# Altium footprint library ATROTECH.PcbLib: 334 footprints (part 19 of 21)
Each footprint in its own frame and in the unit in brackets; x right, y up, seen from the top. Pads: shape width x height; smd on the part's side, far side on the other; paste and mask are expansions set on the pad; w line width, h text height; cw(c..) or ccw(c..) is an arc to the next point about the centre after c.
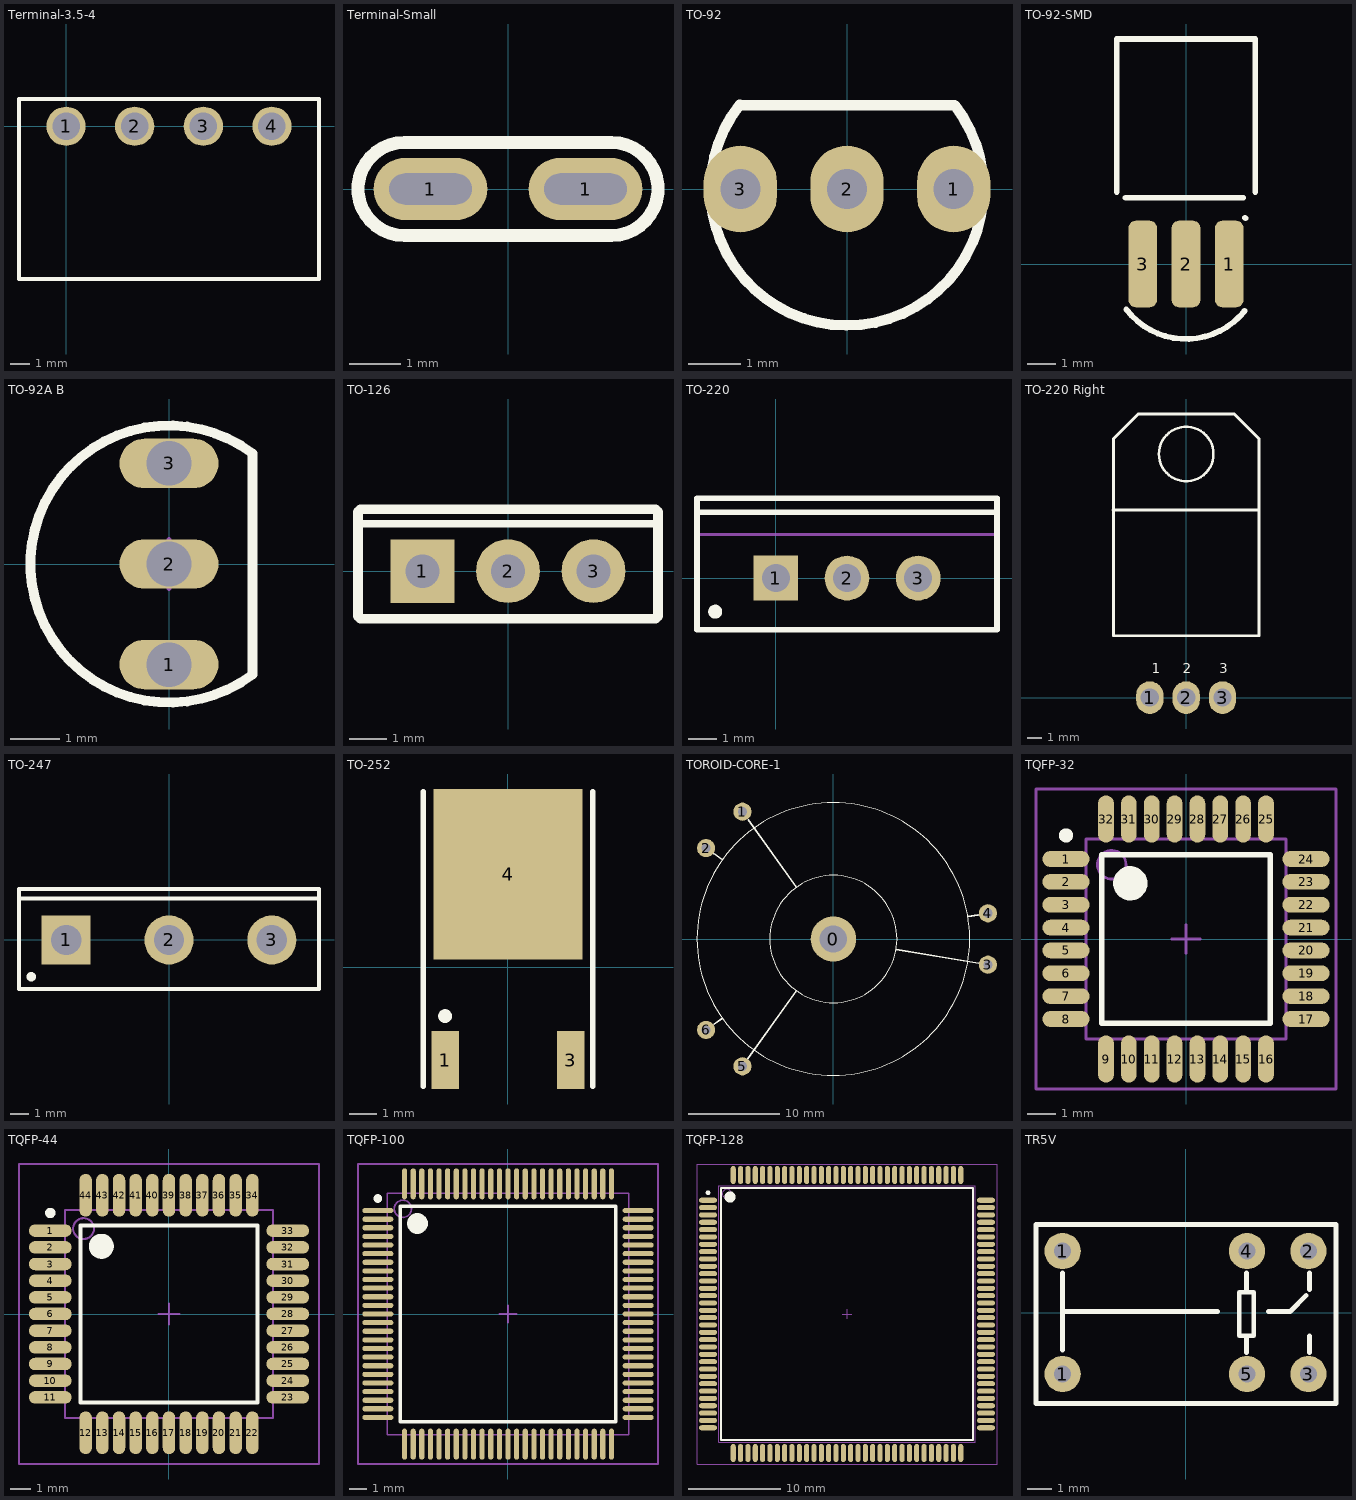
[diagram p18: the footprints below, top view; thin cyan lines are the x and y axes]

## Terminal-3.5-4 [mm]
pads (4):
  round 2 hole 1.4: 1(0,0) 2(3.5,0) 3(7,0) 4(10.5,0)
Top Overlay:
  lines w0.2: -2.4,-7.8 -2.4,1.4 12.9,1.4 12.9,-7.8 -2.4,-7.8

## Terminal-Small [mm]
pads (2):
  oval 2.2x1.2 hole 0.6 slot 1.6 at 0 deg: 1(-1.5,0) 1(1.5,0)
Top Overlay:
  lines w0.254: -2,-0.9 cw(c-2,0) -2,0.9 2,0.9 cw(c2,0) 2,-0.9 -2,-0.9

## TO-92 [mil]
pads (3):
  oval 55x65 hole 30: 1(80,0) 2(0,0) 3(-80,0)
Top Overlay:
  lines w7.87: -80.54,63.17 ccw(c0,0) 81.13,62.41 80.55,62.99 -80.31,62.99
3D body "SW3dPS-TO-92A.STEP": height 314.96, standoff -118.11, extent -97.49,-90.72 91.49,64

## TO-92-SMD [mm]
pads (3):
  rrect50% 1x3 smd: 1(1.5,0) 2(0,0) 3(-1.5,0)
Top Overlay:
  lines w0.2: -2.4,2.5 -2.4,7.8 2.4,7.8 2.4,2.5 ; -2.1,2.3 1.986,2.3 ; -2.068,-1.576 ccw(c0,0) 2.03,-1.624 ; 2.046,1.6 2.061,1.585
3D body "SW3dPS-TO-92A.STEP": height 2.4, standoff -1.53, extent -2.4,-3.2 2.4,7.8

## TO-92A B [mm]
pads (3):
  oval 2x1 hole 0.9: 1(0,-2.032) 2(0,0) 3(0,2.032)
Top Overlay:
  lines w0.2: 1.691,-2.232 cw(c0,0) 1.691,2.232 1.691,-2.232
Mechanical 15:
  lines w0.1: -0.5,0 0.5,0 ; 0,-0.5 0,0.5

## TO-126 [mm]
pads (3):
  rect 1.7x1.7 hole 0.9: 1(-2.28,0)
  round 1.7 hole 0.9: 2(0,0) 3(2.28,0)
Top Overlay:
  lines w0.2: -4,1.27 4,1.27
  lines w0.254: -4,-1.207 -4,1.27 -4,1.588 -3.937,1.651 3.937,1.651 4,1.588 4,1.27 4,-1.206 3.936,-1.27 -3.937,-1.27 -4,-1.207

## TO-220 [mm]
pads (3):
  rect 1.6x1.6 hole 1: 1(0,0)
  round 1.6 hole 1: 2(2.54,0) 3(5.08,0)
Top Overlay:
  circle w0.25: c-2.16,-1.2 r0.125
  lines w0.2: -2.81,2.35 7.89,2.35 ; -2.81,-1.85 -2.81,2.85 7.89,2.85 7.89,-1.85 -2.81,-1.85
Mechanical 13:
  lines w0.1: -2.81,1.55 7.89,1.55 ; -2.81,-1.85 7.89,-1.85 7.89,2.85 -2.81,2.85 -2.81,-1.85
Mechanical 15:
  lines w0.1: 2.04,0 3.04,0 ; 2.54,-0.5 2.54,0.5
3D body "User Library-TO-220-4.STEP": height 20.06, standoff -8.74, extent -2.56,-1.833 7.64,2.667

## TO-220 Right [mil]
height 196.85
pads (3):
  oval 75x90 hole 50: 1(-100,0) 2(0,0) 3(100,0)
Top Overlay:
  circle w7: c0,670 r75
  lines w7.87: -201,516.22 199,516.22 ; -200,170 200,170 200,712 132,780 -132,780 -200,712 -200,578.74 -200,170
  text "1" at -95,66.93 h27.56
  text "3" at 91,66.93 h27.56
  text "2" at -10,66.93 h27.56
3D body "78XXCV.STEP": height 175, standoff -112.5, extent -198,-8 202,776

## TO-247 [mm] "SIP with Mounting Hole; 3 Leads; Body 20 x 15.6 x 5 mm (typ); Pitch 5.45 mm"
pads (3):
  rect 2.6x2.6 hole 1.6: 1(-5.45,0)
  round 2.6 hole 1.6: 2(0,0) 3(5.45,0)
Top Overlay:
  circle w0.25: c-7.3,-1.95 r0.125
  lines w0.2: -7.95,2.2 7.95,2.2 ; -7.95,-2.6 -7.95,2.7 7.95,2.7 7.95,-2.6 -7.95,-2.6
Mechanical 13:
  lines w0.1: -7.95,-2.6 -7.95,2.7 7.95,2.7 7.95,-2.6 -7.95,-2.6
Mechanical 15:
  lines w0.1: -0.5,0 0.5,0 ; 0,-0.5 0,0.5
3D body "User Library-PG-TO247-3-21.step": height 25.95, standoff -15.18, extent -8.077,-2.794 7.823,2.306

## TO-252 [mm]
pads (3):
  rect 1x2.1 smd: 1(-2.285,-3.375) 3(2.285,-3.375)
  rect 5.4x6.2 smd: 4(0,3.375)
Top Overlay:
  circle w0.25: c-2.285,-1.775 r0.125
  lines w0.2: -3.085,-4.325 -3.085,6.375 ; 3.085,-4.325 3.085,6.375
3D body "User Library-DPAK-1.step": height 2.39, standoff -0.02, extent -3.27,-4.111 3.27,5.827

## TOROID-CORE-1 [mm]
pads (7):
  round 5 hole 3: 0(0,0)
  round 2 hole 1: 1(-10,14) 2(-14,10) 3(17,-2.829) 4(17,2.828) 5(-10,-14) 6(-14,-10)
Top Overlay:
  circle w0.1: c0,0 r15
  circle w0.1: c0,0 r7
  lines w0.2: -13.186,9.419 -12.193,8.709 ; -13.12,-9.372 -12.241,-8.743 ; -9.419,-13.186 -4.081,-5.714 ; -9.372,13.12 -4.081,5.714 ; 6.908,-1.149 15.99,-2.66 ; 14.806,2.463 15.909,2.647
3D body "User Library-toroid_2200LL-102-RC.step": height 15.66, standoff -12.7, extent -16.269,-16.214 16.269,16.215

## TQFP-32 [mm]
pads (32):
  oval 1.65x0.55 smd: 1(-4.2,2.8) 2(-4.2,2) 3(-4.2,1.2) 4(-4.2,0.4) 5(-4.2,-0.4) 6(-4.2,-1.2) 7(-4.2,-2) 8(-4.2,-2.8) 17(4.2,-2.8) 18(4.2,-2) 19(4.2,-1.2) 20(4.2,-0.4) 21(4.2,0.4) 22(4.2,1.2) 23(4.2,2) 24(4.2,2.8)
  oval 0.55x1.65 smd: 9(-2.8,-4.2) 10(-2,-4.2) 11(-1.2,-4.2) 12(-0.4,-4.2) 13(0.4,-4.2) 14(1.2,-4.2) 15(2,-4.2) 16(2.8,-4.2) 25(2.8,4.2) 26(2,4.2) 27(1.2,4.2) 28(0.4,4.2) 29(-0.4,4.2) 30(-1.2,4.2) 31(-2,4.2) 32(-2.8,4.2)
Top Overlay:
  circle w0.25: c-4.2,3.625 r0.125
  circle w0.6: c-1.95,1.95 r0.3
  lines w0.2: -2.95,-2.95 -2.95,2.95 2.95,2.95 2.95,-2.95 -2.95,-2.95
Mechanical 13:
  circle w0.1: c-2.6,2.6 r0.5
  lines w0.1: -3.5,-3.5 -3.5,3.5 3.5,3.5 3.5,-3.5 -3.5,-3.5
Mechanical 15:
  lines w0.1: -0.5,0 0.5,0 ; 0,-0.5 0,0.5 ; -5.25,-5.25 -5.25,5.25 5.25,5.25 5.25,-5.25 -5.25,-5.25
3D body "TQFP 32.stp": height 1.2, standoff 0, extent -4.509,-4.494 4.491,4.506

## TQFP-44 [mm]
pads (44):
  oval 2.05x0.6 smd: 1(-5.7,4) 2(-5.7,3.2) 3(-5.7,2.4) 4(-5.7,1.6) 5(-5.7,0.8) 6(-5.7,0) 7(-5.7,-0.8) 8(-5.7,-1.6) 9(-5.7,-2.4) 10(-5.7,-3.2) 11(-5.7,-4) 23(5.7,-4) 24(5.7,-3.2) 25(5.7,-2.4) 26(5.7,-1.6) 27(5.7,-0.8) 28(5.7,0) 29(5.7,0.8) 30(5.7,1.6) 31(5.7,2.4) 32(5.7,3.2) 33(5.7,4)
  oval 0.6x2.05 smd: 12(-4,-5.7) 13(-3.2,-5.7) 14(-2.4,-5.7) 15(-1.6,-5.7) 16(-0.8,-5.7) 17(0,-5.7) 18(0.8,-5.7) 19(1.6,-5.7) 20(2.4,-5.7) 21(3.2,-5.7) 22(4,-5.7) 34(4,5.7) 35(3.2,5.7) 36(2.4,5.7) 37(1.6,5.7) 38(0.8,5.7) 39(0,5.7) 40(-0.8,5.7) 41(-1.6,5.7) 42(-2.4,5.7) 43(-3.2,5.7) 44(-4,5.7)
Top Overlay:
  circle w0.25: c-5.7,4.85 r0.125
  circle w0.6: c-3.25,3.25 r0.3
  lines w0.2: -4.25,-4.25 -4.25,4.25 4.25,4.25 4.25,-4.25 -4.25,-4.25
Mechanical 13:
  circle w0.1: c-4.1,4.1 r0.5
  lines w0.1: -5,-5 -5,5 5,5 5,-5 -5,-5
Mechanical 15:
  lines w0.1: -0.5,0 0.5,0 ; 0,-0.5 0,0.5 ; -7.2,-7.2 -7.2,7.2 7.2,7.2 7.2,-7.2 -7.2,-7.2
3D body "tqfp-44.STEP": height 1.1, standoff -0.01, extent -6,-6 6,6

## TQFP-100 [mm]
pads (100):
  oval 1.8x0.3 smd: 1(-7.55,6) 2(-7.55,5.5) 3(-7.55,5) 4(-7.55,4.5) 5(-7.55,4) 6(-7.55,3.5) 7(-7.55,3) 8(-7.55,2.5) 9(-7.55,2) 10(-7.55,1.5) 11(-7.55,1) 12(-7.55,0.5) 13(-7.55,0) 14(-7.55,-0.5) 15(-7.55,-1) 16(-7.55,-1.5) 17(-7.55,-2) 18(-7.55,-2.5) 19(-7.55,-3) 20(-7.55,-3.5) 21(-7.55,-4) 22(-7.55,-4.5) 23(-7.55,-5) 24(-7.55,-5.5) 25(-7.55,-6) 51(7.55,-6) 52(7.55,-5.5) 53(7.55,-5) 54(7.55,-4.5) 55(7.55,-4) 56(7.55,-3.5) 57(7.55,-3) 58(7.55,-2.5) 59(7.55,-2) 60(7.55,-1.5) 61(7.55,-1) 62(7.55,-0.5) 63(7.55,0) 64(7.55,0.5) 65(7.55,1) 66(7.55,1.5) 67(7.55,2) 68(7.55,2.5) 69(7.55,3) 70(7.55,3.5) 71(7.55,4) 72(7.55,4.5) 73(7.55,5) 74(7.55,5.5) 75(7.55,6)
  oval 0.3x1.8 smd: 26(-6,-7.55) 27(-5.5,-7.55) 28(-5,-7.55) 29(-4.5,-7.55) 30(-4,-7.55) 31(-3.5,-7.55) 32(-3,-7.55) 33(-2.5,-7.55) 34(-2,-7.55) 35(-1.5,-7.55) 36(-1,-7.55) 37(-0.5,-7.55) 38(0,-7.55) 39(0.5,-7.55) 40(1,-7.55) 41(1.5,-7.55) 42(2,-7.55) 43(2.5,-7.55) 44(3,-7.55) 45(3.5,-7.55) 46(4,-7.55) 47(4.5,-7.55) 48(5,-7.55) 49(5.5,-7.55) 50(6,-7.55) 76(6,7.55) 77(5.5,7.55) 78(5,7.55) 79(4.5,7.55) 80(4,7.55) 81(3.5,7.55) 82(3,7.55) 83(2.5,7.55) 84(2,7.55) 85(1.5,7.55) 86(1,7.55) 87(0.5,7.55) 88(0,7.55) 89(-0.5,7.55) 90(-1,7.55) 91(-1.5,7.55) 92(-2,7.55) 93(-2.5,7.55) 94(-3,7.55) 95(-3.5,7.55) 96(-4,7.55) 97(-4.5,7.55) 98(-5,7.55) 99(-5.5,7.55) 100(-6,7.55)
Top Overlay:
  circle w0.6: c-5.25,5.25 r0.3
  circle w0.25: c-7.55,6.7 r0.125
  lines w0.2: -6.25,-6.25 6.25,-6.25 6.25,6.25 -6.25,6.25 -6.25,-6.25
Mechanical 13:
  circle w0.1: c-6.1,6.1 r0.5
  lines w0.1: -7,-7 7,-7 7,7 -7,7 -7,-7
Mechanical 15:
  lines w0.1: -0.5,0 0.5,0 ; 0,-0.5 0,0.5 ; -8.7,-8.7 8.7,-8.7 8.7,8.7 -8.7,8.7 -8.7,-8.7
3D body "TQFP 100.STEP": height 1.1, standoff 0, extent -8.008,-8.008 8.008,8.008

## TQFP-128 [mm]
pads (128):
  oval 1.95x0.55 smd: 1(-1116.062,-1183.305) 2(-1116.062,-1184.105) 3(-1116.062,-1184.905) 4(-1116.062,-1185.705) 5(-1116.062,-1186.505) 6(-1116.062,-1187.305) 7(-1116.062,-1188.105) 8(-1116.062,-1188.905) 9(-1116.062,-1189.705) 10(-1116.062,-1190.505) 11(-1116.062,-1191.305) 12(-1116.062,-1192.105) 13(-1116.062,-1192.905) 14(-1116.062,-1193.705) 15(-1116.062,-1194.505) 16(-1116.062,-1195.305) 17(-1116.062,-1196.105) 18(-1116.062,-1196.905) 19(-1116.062,-1197.705) 20(-1116.062,-1198.505) 21(-1116.062,-1199.305) 22(-1116.062,-1200.105) 23(-1116.062,-1200.905) 24(-1116.062,-1201.705) 25(-1116.062,-1202.505) 26(-1116.062,-1203.305) 27(-1116.062,-1204.105) 28(-1116.062,-1204.905) 29(-1116.062,-1205.705) 30(-1116.062,-1206.505) 31(-1116.062,-1207.305) 32(-1116.062,-1208.105) 65(-1085.762,-1208.105) 66(-1085.762,-1207.305) 67(-1085.762,-1206.505) 68(-1085.762,-1205.705) 69(-1085.762,-1204.905) 70(-1085.762,-1204.105) 71(-1085.762,-1203.305) 72(-1085.762,-1202.505) 73(-1085.762,-1201.705) 74(-1085.762,-1200.905) 75(-1085.762,-1200.105) 76(-1085.762,-1199.305) 77(-1085.762,-1198.505) 78(-1085.762,-1197.705) 79(-1085.762,-1196.905) 80(-1085.762,-1196.105) 81(-1085.762,-1195.305) 82(-1085.762,-1194.505) 83(-1085.762,-1193.705) 84(-1085.762,-1192.905) 85(-1085.762,-1192.105) 86(-1085.762,-1191.305) 87(-1085.762,-1190.505) 88(-1085.762,-1189.705) 89(-1085.762,-1188.905) 90(-1085.762,-1188.105) 91(-1085.762,-1187.305) 92(-1085.762,-1186.505) 93(-1085.762,-1185.705) 94(-1085.762,-1184.905) 95(-1085.762,-1184.105) 96(-1085.762,-1183.305)
  oval 0.55x1.95 smd: 33(-1113.312,-1210.855) 34(-1112.512,-1210.855) 35(-1111.712,-1210.855) 36(-1110.912,-1210.855) 37(-1110.112,-1210.855) 38(-1109.312,-1210.855) 39(-1108.512,-1210.855) 40(-1107.712,-1210.855) 41(-1106.912,-1210.855) 42(-1106.112,-1210.855) 43(-1105.312,-1210.855) 44(-1104.512,-1210.855) 45(-1103.712,-1210.855) 46(-1102.912,-1210.855) 47(-1102.112,-1210.855) 48(-1101.312,-1210.855) 49(-1100.512,-1210.855) 50(-1099.712,-1210.855) 51(-1098.912,-1210.855) 52(-1098.112,-1210.855) 53(-1097.312,-1210.855) 54(-1096.512,-1210.855) 55(-1095.712,-1210.855) 56(-1094.912,-1210.855) 57(-1094.112,-1210.855) 58(-1093.312,-1210.855) 59(-1092.512,-1210.855) 60(-1091.712,-1210.855) 61(-1090.912,-1210.855) 62(-1090.112,-1210.855) 63(-1089.312,-1210.855) 64(-1088.512,-1210.855) 97(-1088.512,-1180.555) 98(-1089.312,-1180.555) 99(-1090.112,-1180.555) 100(-1090.912,-1180.555) 101(-1091.712,-1180.555) 102(-1092.512,-1180.555) 103(-1093.312,-1180.555) 104(-1094.112,-1180.555) 105(-1094.912,-1180.555) 106(-1095.712,-1180.555) 107(-1096.512,-1180.555) 108(-1097.312,-1180.555) 109(-1098.112,-1180.555) 110(-1098.912,-1180.555) 111(-1099.712,-1180.555) 112(-1100.512,-1180.555) 113(-1101.312,-1180.555) 114(-1102.112,-1180.555) 115(-1102.912,-1180.555) 116(-1103.712,-1180.555) 117(-1104.512,-1180.555) 118(-1105.312,-1180.555) 119(-1106.112,-1180.555) 120(-1106.912,-1180.555) 121(-1107.712,-1180.555) 122(-1108.512,-1180.555) 123(-1109.312,-1180.555) 124(-1110.112,-1180.555) 125(-1110.912,-1180.555) 126(-1111.712,-1180.555) 127(-1112.512,-1180.555) 128(-1113.312,-1180.555)
Top Overlay:
  circle w0.6: c-1113.662,-1182.955 r0.3
  circle w0.25: c-1116.062,-1182.48 r0.125
  lines w0.2: -1114.662,-1209.455 -1087.162,-1209.455 -1087.162,-1181.955 -1114.662,-1181.955 -1114.662,-1209.455
Mechanical 13:
  circle w0.1: c-1114.012,-1182.605 r0.5
  lines w0.1: -1114.912,-1209.705 -1086.912,-1209.705 -1086.912,-1181.705 -1114.912,-1181.705 -1114.912,-1209.705
Mechanical 15:
  lines w0.1: -1101.412,-1195.705 -1100.412,-1195.705 ; -1100.912,-1196.205 -1100.912,-1195.205 ; -1117.262,-1212.055 -1084.562,-1212.055 -1084.562,-1179.355 -1117.262,-1179.355 -1117.262,-1212.055

## TR5V [mm] "TIANBAO RELAY"
pads (6):
  round 1.5 hole 0.7: 1(-5.08,-2.54) 1(-5.08,2.54) 2(5.08,2.54) 3(5.08,-2.54) 4(2.54,2.54) 5(2.54,-2.54)
Top Overlay:
  lines w0.2: -5.08,-1.56 -5.08,1.64 ; -5.08,0.04 1.32,0.04 ; 2.52,-1.66 2.52,-0.96 ; 2.52,0.84 2.52,1.64 ; 3.42,0.04 4.32,0.04 4.99,0.71 ; 5.12,-1.66 5.12,-0.96 ; 5.12,0.94 5.12,1.64 ; 2.52,-0.96 2.82,-0.96 2.82,-0.86 2.82,0.84 2.22,0.84 2.22,-0.96 2.52,-0.96 ; -6.18,-3.76 -6.18,3.64 6.22,3.64 6.22,-3.76 -6.18,-3.76
3D body "User Library-TR5V L-S-Z.step": height 10, standoff -3.5, extent -6.2,-3.7 6.2,3.7